# Altium footprint library ref-packages.PCBLIB: 1543 footprints (part 82 of 103)
Each footprint in its own frame and in the unit in brackets; x right, y up, seen from the top. Pads: shape width x height; smd on the part's side, far side on the other; paste and mask are expansions set on the pad; w line width, h text height; cw(c..) or ccw(c..) is an arc to the next point about the centre after c.
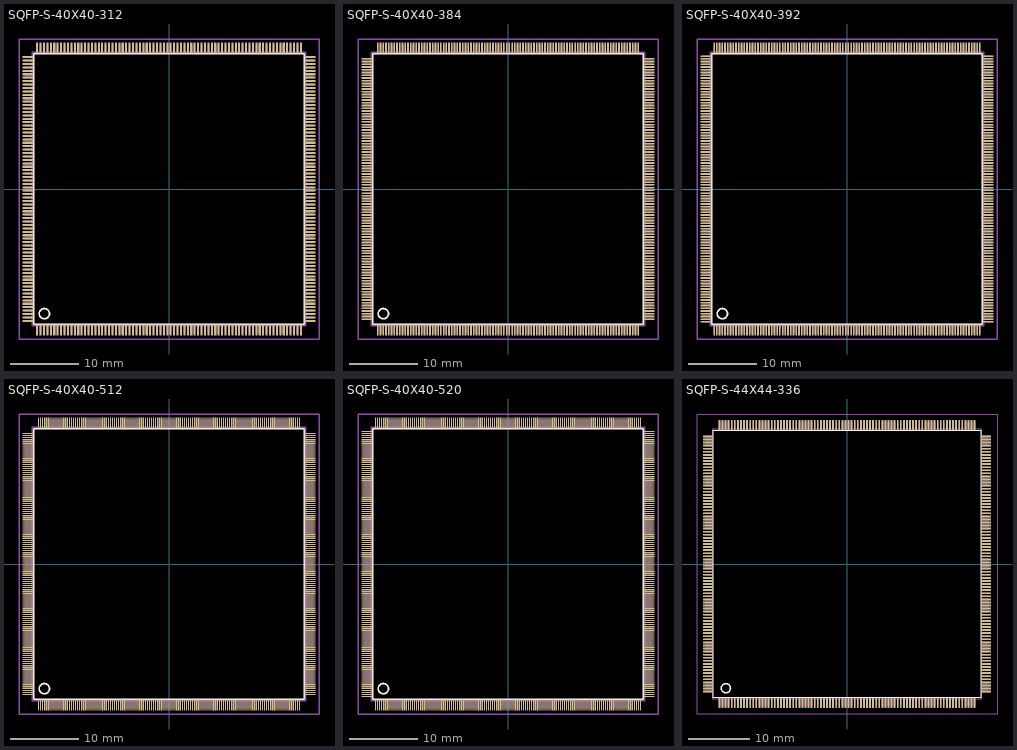
[diagram p81: the footprints below, top view; thin cyan lines are the x and y axes]

## SQFP-S-40X40-312 [mil]
pads (312):
  rect 11.81x62.99 smd: 1(-757.87,-811.02) 2(-738.19,-811.02) 3(-718.5,-811.02) 4(-698.82,-811.02) 5(-679.13,-811.02) 6(-659.45,-811.02) 7(-639.76,-811.02) 8(-620.08,-811.02) 9(-600.39,-811.02) 10(-580.71,-811.02) 11(-561.02,-811.02) 12(-541.34,-811.02) 13(-521.65,-811.02) 14(-501.97,-811.02) 15(-482.28,-811.02) 16(-462.6,-811.02) 17(-442.91,-811.02) 18(-423.23,-811.02) 19(-403.54,-811.02) 20(-383.86,-811.02) 21(-364.17,-811.02) 22(-344.49,-811.02) 23(-324.8,-811.02) 24(-305.12,-811.02) 25(-285.43,-811.02) 26(-265.75,-811.02) 27(-246.06,-811.02) 28(-226.38,-811.02) 29(-206.69,-811.02) 30(-187.01,-811.02) 31(-167.32,-811.02) 32(-147.64,-811.02) 33(-127.95,-811.02) 34(-108.27,-811.02) 35(-88.58,-811.02) 36(-68.9,-811.02) 37(-49.21,-811.02) 38(-29.53,-811.02) 39(-9.84,-811.02) 40(9.84,-811.02) 41(29.53,-811.02) 42(49.21,-811.02) 43(68.9,-811.02) 44(88.58,-811.02) 45(108.27,-811.02) 46(127.95,-811.02) 47(147.64,-811.02) 48(167.32,-811.02) 49(187.01,-811.02) 50(206.69,-811.02) 51(226.38,-811.02) 52(246.06,-811.02) 53(265.75,-811.02) 54(285.43,-811.02) 55(305.12,-811.02) 56(324.8,-811.02) 57(344.49,-811.02) 58(364.17,-811.02) 59(383.86,-811.02) 60(403.54,-811.02) 61(423.23,-811.02) 62(442.91,-811.02) 63(462.6,-811.02) 64(482.28,-811.02) 65(501.97,-811.02) 66(521.65,-811.02) 67(541.34,-811.02) 68(561.02,-811.02) 69(580.71,-811.02) 70(600.39,-811.02) 71(620.08,-811.02) 72(639.76,-811.02) 73(659.45,-811.02) 74(679.13,-811.02) 75(698.82,-811.02) 76(718.5,-811.02) 77(738.19,-811.02) 78(757.87,-811.02) 157(757.87,811.02) 158(738.19,811.02) 159(718.5,811.02) 160(698.82,811.02) 161(679.13,811.02) 162(659.45,811.02) 163(639.76,811.02) 164(620.08,811.02) 165(600.39,811.02) 166(580.71,811.02) 167(561.02,811.02) 168(541.34,811.02) 169(521.65,811.02) 170(501.97,811.02) 171(482.28,811.02) 172(462.6,811.02) 173(442.91,811.02) 174(423.23,811.02) 175(403.54,811.02) 176(383.86,811.02) 177(364.17,811.02) 178(344.49,811.02) 179(324.8,811.02) 180(305.12,811.02) 181(285.43,811.02) 182(265.75,811.02) 183(246.06,811.02) 184(226.38,811.02) 185(206.69,811.02) 186(187.01,811.02) 187(167.32,811.02) 188(147.64,811.02) 189(127.95,811.02) 190(108.27,811.02) 191(88.58,811.02) 192(68.9,811.02) 193(49.21,811.02) 194(29.53,811.02) 195(9.84,811.02) 196(-9.84,811.02) 197(-29.53,811.02) 198(-49.21,811.02) 199(-68.9,811.02) 200(-88.58,811.02) 201(-108.27,811.02) 202(-127.95,811.02) 203(-147.64,811.02) 204(-167.32,811.02) 205(-187.01,811.02) 206(-206.69,811.02) 207(-226.38,811.02) 208(-246.06,811.02) 209(-265.75,811.02) 210(-285.43,811.02) 211(-305.12,811.02) 212(-324.8,811.02) 213(-344.49,811.02) 214(-364.17,811.02) 215(-383.86,811.02) 216(-403.54,811.02) 217(-423.23,811.02) 218(-442.91,811.02) 219(-462.6,811.02) 220(-482.28,811.02) 221(-501.97,811.02) 222(-521.65,811.02) 223(-541.34,811.02) 224(-561.02,811.02) 225(-580.71,811.02) 226(-600.39,811.02) 227(-620.08,811.02) 228(-639.76,811.02) 229(-659.45,811.02) 230(-679.13,811.02) 231(-698.82,811.02) 232(-718.5,811.02) 233(-738.19,811.02) 234(-757.87,811.02)
  rect 62.99x11.81 smd: 79(811.02,-757.87) 80(811.02,-738.19) 81(811.02,-718.5) 82(811.02,-698.82) 83(811.02,-679.13) 84(811.02,-659.45) 85(811.02,-639.76) 86(811.02,-620.08) 87(811.02,-600.39) 88(811.02,-580.71) 89(811.02,-561.02) 90(811.02,-541.34) 91(811.02,-521.65) 92(811.02,-501.97) 93(811.02,-482.28) 94(811.02,-462.6) 95(811.02,-442.91) 96(811.02,-423.23) 97(811.02,-403.54) 98(811.02,-383.86) 99(811.02,-364.17) 100(811.02,-344.49) 101(811.02,-324.8) 102(811.02,-305.12) 103(811.02,-285.43) 104(811.02,-265.75) 105(811.02,-246.06) 106(811.02,-226.38) 107(811.02,-206.69) 108(811.02,-187.01) 109(811.02,-167.32) 110(811.02,-147.64) 111(811.02,-127.95) 112(811.02,-108.27) 113(811.02,-88.58) 114(811.02,-68.9) 115(811.02,-49.21) 116(811.02,-29.53) 117(811.02,-9.84) 118(811.02,9.84) 119(811.02,29.53) 120(811.02,49.21) 121(811.02,68.9) 122(811.02,88.58) 123(811.02,108.27) 124(811.02,127.95) 125(811.02,147.64) 126(811.02,167.32) 127(811.02,187.01) 128(811.02,206.69) 129(811.02,226.38) 130(811.02,246.06) 131(811.02,265.75) 132(811.02,285.43) 133(811.02,305.12) 134(811.02,324.8) 135(811.02,344.49) 136(811.02,364.17) 137(811.02,383.86) 138(811.02,403.54) 139(811.02,423.23) 140(811.02,442.91) 141(811.02,462.6) 142(811.02,482.28) 143(811.02,501.97) 144(811.02,521.65) 145(811.02,541.34) 146(811.02,561.02) 147(811.02,580.71) 148(811.02,600.39) 149(811.02,620.08) 150(811.02,639.76) 151(811.02,659.45) 152(811.02,679.13) 153(811.02,698.82) 154(811.02,718.5) 155(811.02,738.19) 156(811.02,757.87) 235(-811.02,757.87) 236(-811.02,738.19) 237(-811.02,718.5) 238(-811.02,698.82) 239(-811.02,679.13) 240(-811.02,659.45) 241(-811.02,639.76) 242(-811.02,620.08) 243(-811.02,600.39) 244(-811.02,580.71) 245(-811.02,561.02) 246(-811.02,541.34) 247(-811.02,521.65) 248(-811.02,501.97) 249(-811.02,482.28) 250(-811.02,462.6) 251(-811.02,442.91) 252(-811.02,423.23) 253(-811.02,403.54) 254(-811.02,383.86) 255(-811.02,364.17) 256(-811.02,344.49) 257(-811.02,324.8) 258(-811.02,305.12) 259(-811.02,285.43) 260(-811.02,265.75) 261(-811.02,246.06) 262(-811.02,226.38) 263(-811.02,206.69) 264(-811.02,187.01) 265(-811.02,167.32) 266(-811.02,147.64) 267(-811.02,127.95) 268(-811.02,108.27) 269(-811.02,88.58) 270(-811.02,68.9) 271(-811.02,49.21) 272(-811.02,29.53) 273(-811.02,9.84) 274(-811.02,-9.84) 275(-811.02,-29.53) 276(-811.02,-49.21) 277(-811.02,-68.9) 278(-811.02,-88.58) 279(-811.02,-108.27) 280(-811.02,-127.95) 281(-811.02,-147.64) 282(-811.02,-167.32) 283(-811.02,-187.01) 284(-811.02,-206.69) 285(-811.02,-226.38) 286(-811.02,-246.06) 287(-811.02,-265.75) 288(-811.02,-285.43) 289(-811.02,-305.12) 290(-811.02,-324.8) 291(-811.02,-344.49) 292(-811.02,-364.17) 293(-811.02,-383.86) 294(-811.02,-403.54) 295(-811.02,-423.23) 296(-811.02,-442.91) 297(-811.02,-462.6) 298(-811.02,-482.28) 299(-811.02,-501.97) 300(-811.02,-521.65) 301(-811.02,-541.34) 302(-811.02,-561.02) 303(-811.02,-580.71) 304(-811.02,-600.39) 305(-811.02,-620.08) 306(-811.02,-639.76) 307(-811.02,-659.45) 308(-811.02,-679.13) 309(-811.02,-698.82) 310(-811.02,-718.5) 311(-811.02,-738.19) 312(-811.02,-757.87)
Top Overlay:
  circle w10: c-716.54,-716.54 r29.53
  lines w8: -778.35,-777.95 777.95,-777.95 777.95,777.95 -778.35,777.95 -778.35,-777.95
Mechanical 16:
  drawing of 316 lines, arcs and shapes, not listed
Mechanical 27:
  lines w7.87: -862.2,-862.2 -862.2,862.2 862.2,862.2 862.2,-862.2 -862.2,-862.2

## SQFP-S-40X40-384 [mm]
pads (384):
  rect 0.25x1.6 smd: 1(-19,-20.6) 2(-18.6,-20.6) 3(-18.2,-20.6) 4(-17.8,-20.6) 5(-17.4,-20.6) 6(-17,-20.6) 7(-16.6,-20.6) 8(-16.2,-20.6) 9(-15.8,-20.6) 10(-15.4,-20.6) 11(-15,-20.6) 12(-14.6,-20.6) 13(-14.2,-20.6) 14(-13.8,-20.6) 15(-13.4,-20.6) 16(-13,-20.6) 17(-12.6,-20.6) 18(-12.2,-20.6) 19(-11.8,-20.6) 20(-11.4,-20.6) 21(-11,-20.6) 22(-10.6,-20.6) 23(-10.2,-20.6) 24(-9.8,-20.6) 25(-9.4,-20.6) 26(-9,-20.6) 27(-8.6,-20.6) 28(-8.2,-20.6) 29(-7.8,-20.6) 30(-7.4,-20.6) 31(-7,-20.6) 32(-6.6,-20.6) 33(-6.2,-20.6) 34(-5.8,-20.6) 35(-5.4,-20.6) 36(-5,-20.6) 37(-4.6,-20.6) 38(-4.2,-20.6) 39(-3.8,-20.6) 40(-3.4,-20.6) 41(-3,-20.6) 42(-2.6,-20.6) 43(-2.2,-20.6) 44(-1.8,-20.6) 45(-1.4,-20.6) 46(-1,-20.6) 47(-0.6,-20.6) 48(-0.2,-20.6) 49(0.2,-20.6) 50(0.6,-20.6) 51(1,-20.6) 52(1.4,-20.6) 53(1.8,-20.6) 54(2.2,-20.6) 55(2.6,-20.6) 56(3,-20.6) 57(3.4,-20.6) 58(3.8,-20.6) 59(4.2,-20.6) 60(4.6,-20.6) 61(5,-20.6) 62(5.4,-20.6) 63(5.8,-20.6) 64(6.2,-20.6) 65(6.6,-20.6) 66(7,-20.6) 67(7.4,-20.6) 68(7.8,-20.6) 69(8.2,-20.6) 70(8.6,-20.6) 71(9,-20.6) 72(9.4,-20.6) 73(9.8,-20.6) 74(10.2,-20.6) 75(10.6,-20.6) 76(11,-20.6) 77(11.4,-20.6) 78(11.8,-20.6) 79(12.2,-20.6) 80(12.6,-20.6) 81(13,-20.6) 82(13.4,-20.6) 83(13.8,-20.6) 84(14.2,-20.6) 85(14.6,-20.6) 86(15,-20.6) 87(15.4,-20.6) 88(15.8,-20.6) 89(16.2,-20.6) 90(16.6,-20.6) 91(17,-20.6) 92(17.4,-20.6) 93(17.8,-20.6) 94(18.2,-20.6) 95(18.6,-20.6) 96(19,-20.6) 193(19,20.6) 194(18.6,20.6) 195(18.2,20.6) 196(17.8,20.6) 197(17.4,20.6) 198(17,20.6) 199(16.6,20.6) 200(16.2,20.6) 201(15.8,20.6) 202(15.4,20.6) 203(15,20.6) 204(14.6,20.6) 205(14.2,20.6) 206(13.8,20.6) 207(13.4,20.6) 208(13,20.6) 209(12.6,20.6) 210(12.2,20.6) 211(11.8,20.6) 212(11.4,20.6) 213(11,20.6) 214(10.6,20.6) 215(10.2,20.6) 216(9.8,20.6) 217(9.4,20.6) 218(9,20.6) 219(8.6,20.6) 220(8.2,20.6) 221(7.8,20.6) 222(7.4,20.6) 223(7,20.6) 224(6.6,20.6) 225(6.2,20.6) 226(5.8,20.6) 227(5.4,20.6) 228(5,20.6) 229(4.6,20.6) 230(4.2,20.6) 231(3.8,20.6) 232(3.4,20.6) 233(3,20.6) 234(2.6,20.6) 235(2.2,20.6) 236(1.8,20.6) 237(1.4,20.6) 238(1,20.6) 239(0.6,20.6) 240(0.2,20.6) 241(-0.2,20.6) 242(-0.6,20.6) 243(-1,20.6) 244(-1.4,20.6) 245(-1.8,20.6) 246(-2.2,20.6) 247(-2.6,20.6) 248(-3,20.6) 249(-3.4,20.6) 250(-3.8,20.6) 251(-4.2,20.6) 252(-4.6,20.6) 253(-5,20.6) 254(-5.4,20.6) 255(-5.8,20.6) 256(-6.2,20.6) 257(-6.6,20.6) 258(-7,20.6) 259(-7.4,20.6) 260(-7.8,20.6) 261(-8.2,20.6) 262(-8.6,20.6) 263(-9,20.6) 264(-9.4,20.6) 265(-9.8,20.6) 266(-10.2,20.6) 267(-10.6,20.6) 268(-11,20.6) 269(-11.4,20.6) 270(-11.8,20.6) 271(-12.2,20.6) 272(-12.6,20.6) 273(-13,20.6) 274(-13.4,20.6) 275(-13.8,20.6) 276(-14.2,20.6) 277(-14.6,20.6) 278(-15,20.6) 279(-15.4,20.6) 280(-15.8,20.6) 281(-16.2,20.6) 282(-16.6,20.6) 283(-17,20.6) 284(-17.4,20.6) 285(-17.8,20.6) 286(-18.2,20.6) 287(-18.6,20.6) 288(-19,20.6)
  rect 1.6x0.25 smd: 97(20.6,-19) 98(20.6,-18.6) 99(20.6,-18.2) 100(20.6,-17.8) 101(20.6,-17.4) 102(20.6,-17) 103(20.6,-16.6) 104(20.6,-16.2) 105(20.6,-15.8) 106(20.6,-15.4) 107(20.6,-15) 108(20.6,-14.6) 109(20.6,-14.2) 110(20.6,-13.8) 111(20.6,-13.4) 112(20.6,-13) 113(20.6,-12.6) 114(20.6,-12.2) 115(20.6,-11.8) 116(20.6,-11.4) 117(20.6,-11) 118(20.6,-10.6) 119(20.6,-10.2) 120(20.6,-9.8) 121(20.6,-9.4) 122(20.6,-9) 123(20.6,-8.6) 124(20.6,-8.2) 125(20.6,-7.8) 126(20.6,-7.4) 127(20.6,-7) 128(20.6,-6.6) 129(20.6,-6.2) 130(20.6,-5.8) 131(20.6,-5.4) 132(20.6,-5) 133(20.6,-4.6) 134(20.6,-4.2) 135(20.6,-3.8) 136(20.6,-3.4) 137(20.6,-3) 138(20.6,-2.6) 139(20.6,-2.2) 140(20.6,-1.8) 141(20.6,-1.4) 142(20.6,-1) 143(20.6,-0.6) 144(20.6,-0.2) 145(20.6,0.2) 146(20.6,0.6) 147(20.6,1) 148(20.6,1.4) 149(20.6,1.8) 150(20.6,2.2) 151(20.6,2.6) 152(20.6,3) 153(20.6,3.4) 154(20.6,3.8) 155(20.6,4.2) 156(20.6,4.6) 157(20.6,5) 158(20.6,5.4) 159(20.6,5.8) 160(20.6,6.2) 161(20.6,6.6) 162(20.6,7) 163(20.6,7.4) 164(20.6,7.8) 165(20.6,8.2) 166(20.6,8.6) 167(20.6,9) 168(20.6,9.4) 169(20.6,9.8) 170(20.6,10.2) 171(20.6,10.6) 172(20.6,11) 173(20.6,11.4) 174(20.6,11.8) 175(20.6,12.2) 176(20.6,12.6) 177(20.6,13) 178(20.6,13.4) 179(20.6,13.8) 180(20.6,14.2) 181(20.6,14.6) 182(20.6,15) 183(20.6,15.4) 184(20.6,15.8) 185(20.6,16.2) 186(20.6,16.6) 187(20.6,17) 188(20.6,17.4) 189(20.6,17.8) 190(20.6,18.2) 191(20.6,18.6) 192(20.6,19) 289(-20.6,19) 290(-20.6,18.6) 291(-20.6,18.2) 292(-20.6,17.8) 293(-20.6,17.4) 294(-20.6,17) 295(-20.6,16.6) 296(-20.6,16.2) 297(-20.6,15.8) 298(-20.6,15.4) 299(-20.6,15) 300(-20.6,14.6) 301(-20.6,14.2) 302(-20.6,13.8) 303(-20.6,13.4) 304(-20.6,13) 305(-20.6,12.6) 306(-20.6,12.2) 307(-20.6,11.8) 308(-20.6,11.4) 309(-20.6,11) 310(-20.6,10.6) 311(-20.6,10.2) 312(-20.6,9.8) 313(-20.6,9.4) 314(-20.6,9) 315(-20.6,8.6) 316(-20.6,8.2) 317(-20.6,7.8) 318(-20.6,7.4) 319(-20.6,7) 320(-20.6,6.6) 321(-20.6,6.2) 322(-20.6,5.8) 323(-20.6,5.4) 324(-20.6,5) 325(-20.6,4.6) 326(-20.6,4.2) 327(-20.6,3.8) 328(-20.6,3.4) 329(-20.6,3) 330(-20.6,2.6) 331(-20.6,2.2) 332(-20.6,1.8) 333(-20.6,1.4) 334(-20.6,1) 335(-20.6,0.6) 336(-20.6,0.2) 337(-20.6,-0.2) 338(-20.6,-0.6) 339(-20.6,-1) 340(-20.6,-1.4) 341(-20.6,-1.8) 342(-20.6,-2.2) 343(-20.6,-2.6) 344(-20.6,-3) 345(-20.6,-3.4) 346(-20.6,-3.8) 347(-20.6,-4.2) 348(-20.6,-4.6) 349(-20.6,-5) 350(-20.6,-5.4) 351(-20.6,-5.8) 352(-20.6,-6.2) 353(-20.6,-6.6) 354(-20.6,-7) 355(-20.6,-7.4) 356(-20.6,-7.8) 357(-20.6,-8.2) 358(-20.6,-8.6) 359(-20.6,-9) 360(-20.6,-9.4) 361(-20.6,-9.8) 362(-20.6,-10.2) 363(-20.6,-10.6) 364(-20.6,-11) 365(-20.6,-11.4) 366(-20.6,-11.8) 367(-20.6,-12.2) 368(-20.6,-12.6) 369(-20.6,-13) 370(-20.6,-13.4) 371(-20.6,-13.8) 372(-20.6,-14.2) 373(-20.6,-14.6) 374(-20.6,-15) 375(-20.6,-15.4) 376(-20.6,-15.8) 377(-20.6,-16.2) 378(-20.6,-16.6) 379(-20.6,-17) 380(-20.6,-17.4) 381(-20.6,-17.8) 382(-20.6,-18.2) 383(-20.6,-18.6) 384(-20.6,-19)
Top Overlay:
  circle w0.254: c-18.2,-18.2 r0.75
  lines w0.203: -19.77,-19.76 19.76,-19.76 19.76,19.76 -19.77,19.76 -19.77,-19.76
Mechanical 16:
  drawing of 388 lines, arcs and shapes, not listed
Mechanical 27:
  lines w0.2: -21.9,-21.9 -21.9,21.9 21.9,21.9 21.9,-21.9 -21.9,-21.9

## SQFP-S-40X40-392 [mm]
pads (392):
  rect 0.25x1.6 smd: 1(-19.4,-20.6) 2(-19,-20.6) 3(-18.6,-20.6) 4(-18.2,-20.6) 5(-17.8,-20.6) 6(-17.4,-20.6) 7(-17,-20.6) 8(-16.6,-20.6) 9(-16.2,-20.6) 10(-15.8,-20.6) 11(-15.4,-20.6) 12(-15,-20.6) 13(-14.6,-20.6) 14(-14.2,-20.6) 15(-13.8,-20.6) 16(-13.4,-20.6) 17(-13,-20.6) 18(-12.6,-20.6) 19(-12.2,-20.6) 20(-11.8,-20.6) 21(-11.4,-20.6) 22(-11,-20.6) 23(-10.6,-20.6) 24(-10.2,-20.6) 25(-9.8,-20.6) 26(-9.4,-20.6) 27(-9,-20.6) 28(-8.6,-20.6) 29(-8.2,-20.6) 30(-7.8,-20.6) 31(-7.4,-20.6) 32(-7,-20.6) 33(-6.6,-20.6) 34(-6.2,-20.6) 35(-5.8,-20.6) 36(-5.4,-20.6) 37(-5,-20.6) 38(-4.6,-20.6) 39(-4.2,-20.6) 40(-3.8,-20.6) 41(-3.4,-20.6) 42(-3,-20.6) 43(-2.6,-20.6) 44(-2.2,-20.6) 45(-1.8,-20.6) 46(-1.4,-20.6) 47(-1,-20.6) 48(-0.6,-20.6) 49(-0.2,-20.6) 50(0.2,-20.6) 51(0.6,-20.6) 52(1,-20.6) 53(1.4,-20.6) 54(1.8,-20.6) 55(2.2,-20.6) 56(2.6,-20.6) 57(3,-20.6) 58(3.4,-20.6) 59(3.8,-20.6) 60(4.2,-20.6) 61(4.6,-20.6) 62(5,-20.6) 63(5.4,-20.6) 64(5.8,-20.6) 65(6.2,-20.6) 66(6.6,-20.6) 67(7,-20.6) 68(7.4,-20.6) 69(7.8,-20.6) 70(8.2,-20.6) 71(8.6,-20.6) 72(9,-20.6) 73(9.4,-20.6) 74(9.8,-20.6) 75(10.2,-20.6) 76(10.6,-20.6) 77(11,-20.6) 78(11.4,-20.6) 79(11.8,-20.6) 80(12.2,-20.6) 81(12.6,-20.6) 82(13,-20.6) 83(13.4,-20.6) 84(13.8,-20.6) 85(14.2,-20.6) 86(14.6,-20.6) 87(15,-20.6) 88(15.4,-20.6) 89(15.8,-20.6) 90(16.2,-20.6) 91(16.6,-20.6) 92(17,-20.6) 93(17.4,-20.6) 94(17.8,-20.6) 95(18.2,-20.6) 96(18.6,-20.6) 97(19,-20.6) 98(19.4,-20.6) 197(19.4,20.6) 198(19,20.6) 199(18.6,20.6) 200(18.2,20.6) 201(17.8,20.6) 202(17.4,20.6) 203(17,20.6) 204(16.6,20.6) 205(16.2,20.6) 206(15.8,20.6) 207(15.4,20.6) 208(15,20.6) 209(14.6,20.6) 210(14.2,20.6) 211(13.8,20.6) 212(13.4,20.6) 213(13,20.6) 214(12.6,20.6) 215(12.2,20.6) 216(11.8,20.6) 217(11.4,20.6) 218(11,20.6) 219(10.6,20.6) 220(10.2,20.6) 221(9.8,20.6) 222(9.4,20.6) 223(9,20.6) 224(8.6,20.6) 225(8.2,20.6) 226(7.8,20.6) 227(7.4,20.6) 228(7,20.6) 229(6.6,20.6) 230(6.2,20.6) 231(5.8,20.6) 232(5.4,20.6) 233(5,20.6) 234(4.6,20.6) 235(4.2,20.6) 236(3.8,20.6) 237(3.4,20.6) 238(3,20.6) 239(2.6,20.6) 240(2.2,20.6) 241(1.8,20.6) 242(1.4,20.6) 243(1,20.6) 244(0.6,20.6) 245(0.2,20.6) 246(-0.2,20.6) 247(-0.6,20.6) 248(-1,20.6) 249(-1.4,20.6) 250(-1.8,20.6) 251(-2.2,20.6) 252(-2.6,20.6) 253(-3,20.6) 254(-3.4,20.6) 255(-3.8,20.6) 256(-4.2,20.6) 257(-4.6,20.6) 258(-5,20.6) 259(-5.4,20.6) 260(-5.8,20.6) 261(-6.2,20.6) 262(-6.6,20.6) 263(-7,20.6) 264(-7.4,20.6) 265(-7.8,20.6) 266(-8.2,20.6) 267(-8.6,20.6) 268(-9,20.6) 269(-9.4,20.6) 270(-9.8,20.6) 271(-10.2,20.6) 272(-10.6,20.6) 273(-11,20.6) 274(-11.4,20.6) 275(-11.8,20.6) 276(-12.2,20.6) 277(-12.6,20.6) 278(-13,20.6) 279(-13.4,20.6) 280(-13.8,20.6) 281(-14.2,20.6) 282(-14.6,20.6) 283(-15,20.6) 284(-15.4,20.6) 285(-15.8,20.6) 286(-16.2,20.6) 287(-16.6,20.6) 288(-17,20.6) 289(-17.4,20.6) 290(-17.8,20.6) 291(-18.2,20.6) 292(-18.6,20.6) 293(-19,20.6) 294(-19.4,20.6)
  rect 1.6x0.25 smd: 99(20.6,-19.4) 100(20.6,-19) 101(20.6,-18.6) 102(20.6,-18.2) 103(20.6,-17.8) 104(20.6,-17.4) 105(20.6,-17) 106(20.6,-16.6) 107(20.6,-16.2) 108(20.6,-15.8) 109(20.6,-15.4) 110(20.6,-15) 111(20.6,-14.6) 112(20.6,-14.2) 113(20.6,-13.8) 114(20.6,-13.4) 115(20.6,-13) 116(20.6,-12.6) 117(20.6,-12.2) 118(20.6,-11.8) 119(20.6,-11.4) 120(20.6,-11) 121(20.6,-10.6) 122(20.6,-10.2) 123(20.6,-9.8) 124(20.6,-9.4) 125(20.6,-9) 126(20.6,-8.6) 127(20.6,-8.2) 128(20.6,-7.8) 129(20.6,-7.4) 130(20.6,-7) 131(20.6,-6.6) 132(20.6,-6.2) 133(20.6,-5.8) 134(20.6,-5.4) 135(20.6,-5) 136(20.6,-4.6) 137(20.6,-4.2) 138(20.6,-3.8) 139(20.6,-3.4) 140(20.6,-3) 141(20.6,-2.6) 142(20.6,-2.2) 143(20.6,-1.8) 144(20.6,-1.4) 145(20.6,-1) 146(20.6,-0.6) 147(20.6,-0.2) 148(20.6,0.2) 149(20.6,0.6) 150(20.6,1) 151(20.6,1.4) 152(20.6,1.8) 153(20.6,2.2) 154(20.6,2.6) 155(20.6,3) 156(20.6,3.4) 157(20.6,3.8) 158(20.6,4.2) 159(20.6,4.6) 160(20.6,5) 161(20.6,5.4) 162(20.6,5.8) 163(20.6,6.2) 164(20.6,6.6) 165(20.6,7) 166(20.6,7.4) 167(20.6,7.8) 168(20.6,8.2) 169(20.6,8.6) 170(20.6,9) 171(20.6,9.4) 172(20.6,9.8) 173(20.6,10.2) 174(20.6,10.6) 175(20.6,11) 176(20.6,11.4) 177(20.6,11.8) 178(20.6,12.2) 179(20.6,12.6) 180(20.6,13) 181(20.6,13.4) 182(20.6,13.8) 183(20.6,14.2) 184(20.6,14.6) 185(20.6,15) 186(20.6,15.4) 187(20.6,15.8) 188(20.6,16.2) 189(20.6,16.6) 190(20.6,17) 191(20.6,17.4) 192(20.6,17.8) 193(20.6,18.2) 194(20.6,18.6) 195(20.6,19) 196(20.6,19.4) 295(-20.6,19.4) 296(-20.6,19) 297(-20.6,18.6) 298(-20.6,18.2) 299(-20.6,17.8) 300(-20.6,17.4) 301(-20.6,17) 302(-20.6,16.6) 303(-20.6,16.2) 304(-20.6,15.8) 305(-20.6,15.4) 306(-20.6,15) 307(-20.6,14.6) 308(-20.6,14.2) 309(-20.6,13.8) 310(-20.6,13.4) 311(-20.6,13) 312(-20.6,12.6) 313(-20.6,12.2) 314(-20.6,11.8) 315(-20.6,11.4) 316(-20.6,11) 317(-20.6,10.6) 318(-20.6,10.2) 319(-20.6,9.8) 320(-20.6,9.4) 321(-20.6,9) 322(-20.6,8.6) 323(-20.6,8.2) 324(-20.6,7.8) 325(-20.6,7.4) 326(-20.6,7) 327(-20.6,6.6) 328(-20.6,6.2) 329(-20.6,5.8) 330(-20.6,5.4) 331(-20.6,5) 332(-20.6,4.6) 333(-20.6,4.2) 334(-20.6,3.8) 335(-20.6,3.4) 336(-20.6,3) 337(-20.6,2.6) 338(-20.6,2.2) 339(-20.6,1.8) 340(-20.6,1.4) 341(-20.6,1) 342(-20.6,0.6) 343(-20.6,0.2) 344(-20.6,-0.2) 345(-20.6,-0.6) 346(-20.6,-1) 347(-20.6,-1.4) 348(-20.6,-1.8) 349(-20.6,-2.2) 350(-20.6,-2.6) 351(-20.6,-3) 352(-20.6,-3.4) 353(-20.6,-3.8) 354(-20.6,-4.2) 355(-20.6,-4.6) 356(-20.6,-5) 357(-20.6,-5.4) 358(-20.6,-5.8) 359(-20.6,-6.2) 360(-20.6,-6.6) 361(-20.6,-7) 362(-20.6,-7.4) 363(-20.6,-7.8) 364(-20.6,-8.2) 365(-20.6,-8.6) 366(-20.6,-9) 367(-20.6,-9.4) 368(-20.6,-9.8) 369(-20.6,-10.2) 370(-20.6,-10.6) 371(-20.6,-11) 372(-20.6,-11.4) 373(-20.6,-11.8) 374(-20.6,-12.2) 375(-20.6,-12.6) 376(-20.6,-13) 377(-20.6,-13.4) 378(-20.6,-13.8) 379(-20.6,-14.2) 380(-20.6,-14.6) 381(-20.6,-15) 382(-20.6,-15.4) 383(-20.6,-15.8) 384(-20.6,-16.2) 385(-20.6,-16.6) 386(-20.6,-17) 387(-20.6,-17.4) 388(-20.6,-17.8) 389(-20.6,-18.2) 390(-20.6,-18.6) 391(-20.6,-19) 392(-20.6,-19.4)
Top Overlay:
  circle w0.254: c-18.2,-18.2 r0.75
  lines w0.203: -19.77,-19.76 19.76,-19.76 19.76,19.76 -19.77,19.76 -19.77,-19.76
Mechanical 16:
  drawing of 396 lines, arcs and shapes, not listed
Mechanical 27:
  lines w0.2: -21.9,-21.9 -21.9,21.9 21.9,21.9 21.9,-21.9 -21.9,-21.9

## SQFP-S-40X40-512 [mm]
pads (512):
  rect 0.17x1.6 smd: 1(-19.05,-20.6) 2(-18.75,-20.6) 3(-18.45,-20.6) 4(-18.15,-20.6) 5(-17.85,-20.6) 6(-17.55,-20.6) 7(-17.25,-20.6) 8(-16.95,-20.6) 9(-16.65,-20.6) 10(-16.35,-20.6) 11(-16.05,-20.6) 12(-15.75,-20.6) 13(-15.45,-20.6) 14(-15.15,-20.6) 15(-14.85,-20.6) 16(-14.55,-20.6) 17(-14.25,-20.6) 18(-13.95,-20.6) 19(-13.65,-20.6) 20(-13.35,-20.6) 21(-13.05,-20.6) 22(-12.75,-20.6) 23(-12.45,-20.6) 24(-12.15,-20.6) 25(-11.85,-20.6) 26(-11.55,-20.6) 27(-11.25,-20.6) 28(-10.95,-20.6) 29(-10.65,-20.6) 30(-10.35,-20.6) 31(-10.05,-20.6) 32(-9.75,-20.6) 33(-9.45,-20.6) 34(-9.15,-20.6) 35(-8.85,-20.6) 36(-8.55,-20.6) 37(-8.25,-20.6) 38(-7.95,-20.6) 39(-7.65,-20.6) 40(-7.35,-20.6) 41(-7.05,-20.6) 42(-6.75,-20.6) 43(-6.45,-20.6) 44(-6.15,-20.6) 45(-5.85,-20.6) 46(-5.55,-20.6) 47(-5.25,-20.6) 48(-4.95,-20.6) 49(-4.65,-20.6) 50(-4.35,-20.6) 51(-4.05,-20.6) 52(-3.75,-20.6) 53(-3.45,-20.6) 54(-3.15,-20.6) 55(-2.85,-20.6) 56(-2.55,-20.6) 57(-2.25,-20.6) 58(-1.95,-20.6) 59(-1.65,-20.6) 60(-1.35,-20.6) 61(-1.05,-20.6) 62(-0.75,-20.6) 63(-0.45,-20.6) 64(-0.15,-20.6) 65(0.15,-20.6) 66(0.45,-20.6) 67(0.75,-20.6) 68(1.05,-20.6) 69(1.35,-20.6) 70(1.65,-20.6) 71(1.95,-20.6) 72(2.25,-20.6) 73(2.55,-20.6) 74(2.85,-20.6) 75(3.15,-20.6) 76(3.45,-20.6) 77(3.75,-20.6) 78(4.05,-20.6) 79(4.35,-20.6) 80(4.65,-20.6) 81(4.95,-20.6) 82(5.25,-20.6) 83(5.55,-20.6) 84(5.85,-20.6) 85(6.15,-20.6) 86(6.45,-20.6) 87(6.75,-20.6) 88(7.05,-20.6) 89(7.35,-20.6) 90(7.65,-20.6) 91(7.95,-20.6) 92(8.25,-20.6) 93(8.55,-20.6) 94(8.85,-20.6) 95(9.15,-20.6) 96(9.45,-20.6) 97(9.75,-20.6) 98(10.05,-20.6) 99(10.35,-20.6) 100(10.65,-20.6) 101(10.95,-20.6) 102(11.25,-20.6) 103(11.55,-20.6) 104(11.85,-20.6) 105(12.15,-20.6) 106(12.45,-20.6) 107(12.75,-20.6) 108(13.05,-20.6) 109(13.35,-20.6) 110(13.65,-20.6) 111(13.95,-20.6) 112(14.25,-20.6) 113(14.55,-20.6) 114(14.85,-20.6) 115(15.15,-20.6) 116(15.45,-20.6) 117(15.75,-20.6) 118(16.05,-20.6) 119(16.35,-20.6) 120(16.65,-20.6) 121(16.95,-20.6) 122(17.25,-20.6) 123(17.55,-20.6) 124(17.85,-20.6) 125(18.15,-20.6) 126(18.45,-20.6) 127(18.75,-20.6) 128(19.05,-20.6) 257(19.05,20.6) 258(18.75,20.6) 259(18.45,20.6) 260(18.15,20.6) 261(17.85,20.6) 262(17.55,20.6) 263(17.25,20.6) 264(16.95,20.6) 265(16.65,20.6) 266(16.35,20.6) 267(16.05,20.6) 268(15.75,20.6) 269(15.45,20.6) 270(15.15,20.6) 271(14.85,20.6) 272(14.55,20.6) 273(14.25,20.6) 274(13.95,20.6) 275(13.65,20.6) 276(13.35,20.6) 277(13.05,20.6) 278(12.75,20.6) 279(12.45,20.6) 280(12.15,20.6) 281(11.85,20.6) 282(11.55,20.6) 283(11.25,20.6) 284(10.95,20.6) 285(10.65,20.6) 286(10.35,20.6) 287(10.05,20.6) 288(9.75,20.6) 289(9.45,20.6) 290(9.15,20.6) 291(8.85,20.6) 292(8.55,20.6) 293(8.25,20.6) 294(7.95,20.6) 295(7.65,20.6) 296(7.35,20.6) 297(7.05,20.6) 298(6.75,20.6) 299(6.45,20.6) 300(6.15,20.6) 301(5.85,20.6) 302(5.55,20.6) 303(5.25,20.6) 304(4.95,20.6) 305(4.65,20.6) 306(4.35,20.6) 307(4.05,20.6) 308(3.75,20.6) 309(3.45,20.6) 310(3.15,20.6) 311(2.85,20.6) 312(2.55,20.6) 313(2.25,20.6) 314(1.95,20.6) 315(1.65,20.6) 316(1.35,20.6) 317(1.05,20.6) 318(0.75,20.6) 319(0.45,20.6) 320(0.15,20.6) 321(-0.15,20.6) 322(-0.45,20.6) 323(-0.75,20.6) 324(-1.05,20.6) 325(-1.35,20.6) 326(-1.65,20.6) 327(-1.95,20.6) 328(-2.25,20.6) 329(-2.55,20.6) 330(-2.85,20.6) 331(-3.15,20.6) 332(-3.45,20.6) 333(-3.75,20.6) 334(-4.05,20.6) 335(-4.35,20.6) 336(-4.65,20.6) 337(-4.95,20.6) 338(-5.25,20.6) 339(-5.55,20.6) 340(-5.85,20.6) 341(-6.15,20.6) 342(-6.45,20.6) 343(-6.75,20.6) 344(-7.05,20.6) 345(-7.35,20.6) 346(-7.65,20.6) 347(-7.95,20.6) 348(-8.25,20.6) 349(-8.55,20.6) 350(-8.85,20.6) 351(-9.15,20.6) 352(-9.45,20.6) 353(-9.75,20.6) 354(-10.05,20.6) 355(-10.35,20.6) 356(-10.65,20.6) 357(-10.95,20.6) 358(-11.25,20.6) 359(-11.55,20.6) 360(-11.85,20.6) 361(-12.15,20.6) 362(-12.45,20.6) 363(-12.75,20.6) 364(-13.05,20.6) 365(-13.35,20.6) 366(-13.65,20.6) 367(-13.95,20.6) 368(-14.25,20.6) 369(-14.55,20.6) 370(-14.85,20.6) 371(-15.15,20.6) 372(-15.45,20.6) 373(-15.75,20.6) 374(-16.05,20.6) 375(-16.35,20.6) 376(-16.65,20.6) 377(-16.95,20.6) 378(-17.25,20.6) 379(-17.55,20.6) 380(-17.85,20.6) 381(-18.15,20.6) 382(-18.45,20.6) 383(-18.75,20.6) 384(-19.05,20.6)